# Altium footprint library CADTcommon.PcbLib: 503 footprints (part 5 of 32)
Each footprint in its own frame and in the unit in brackets; x right, y up, seen from the top. Pads: shape width x height; smd on the part's side, far side on the other; paste and mask are expansions set on the pad; w line width, h text height; cw(c..) or ccw(c..) is an arc to the next point about the centre after c.
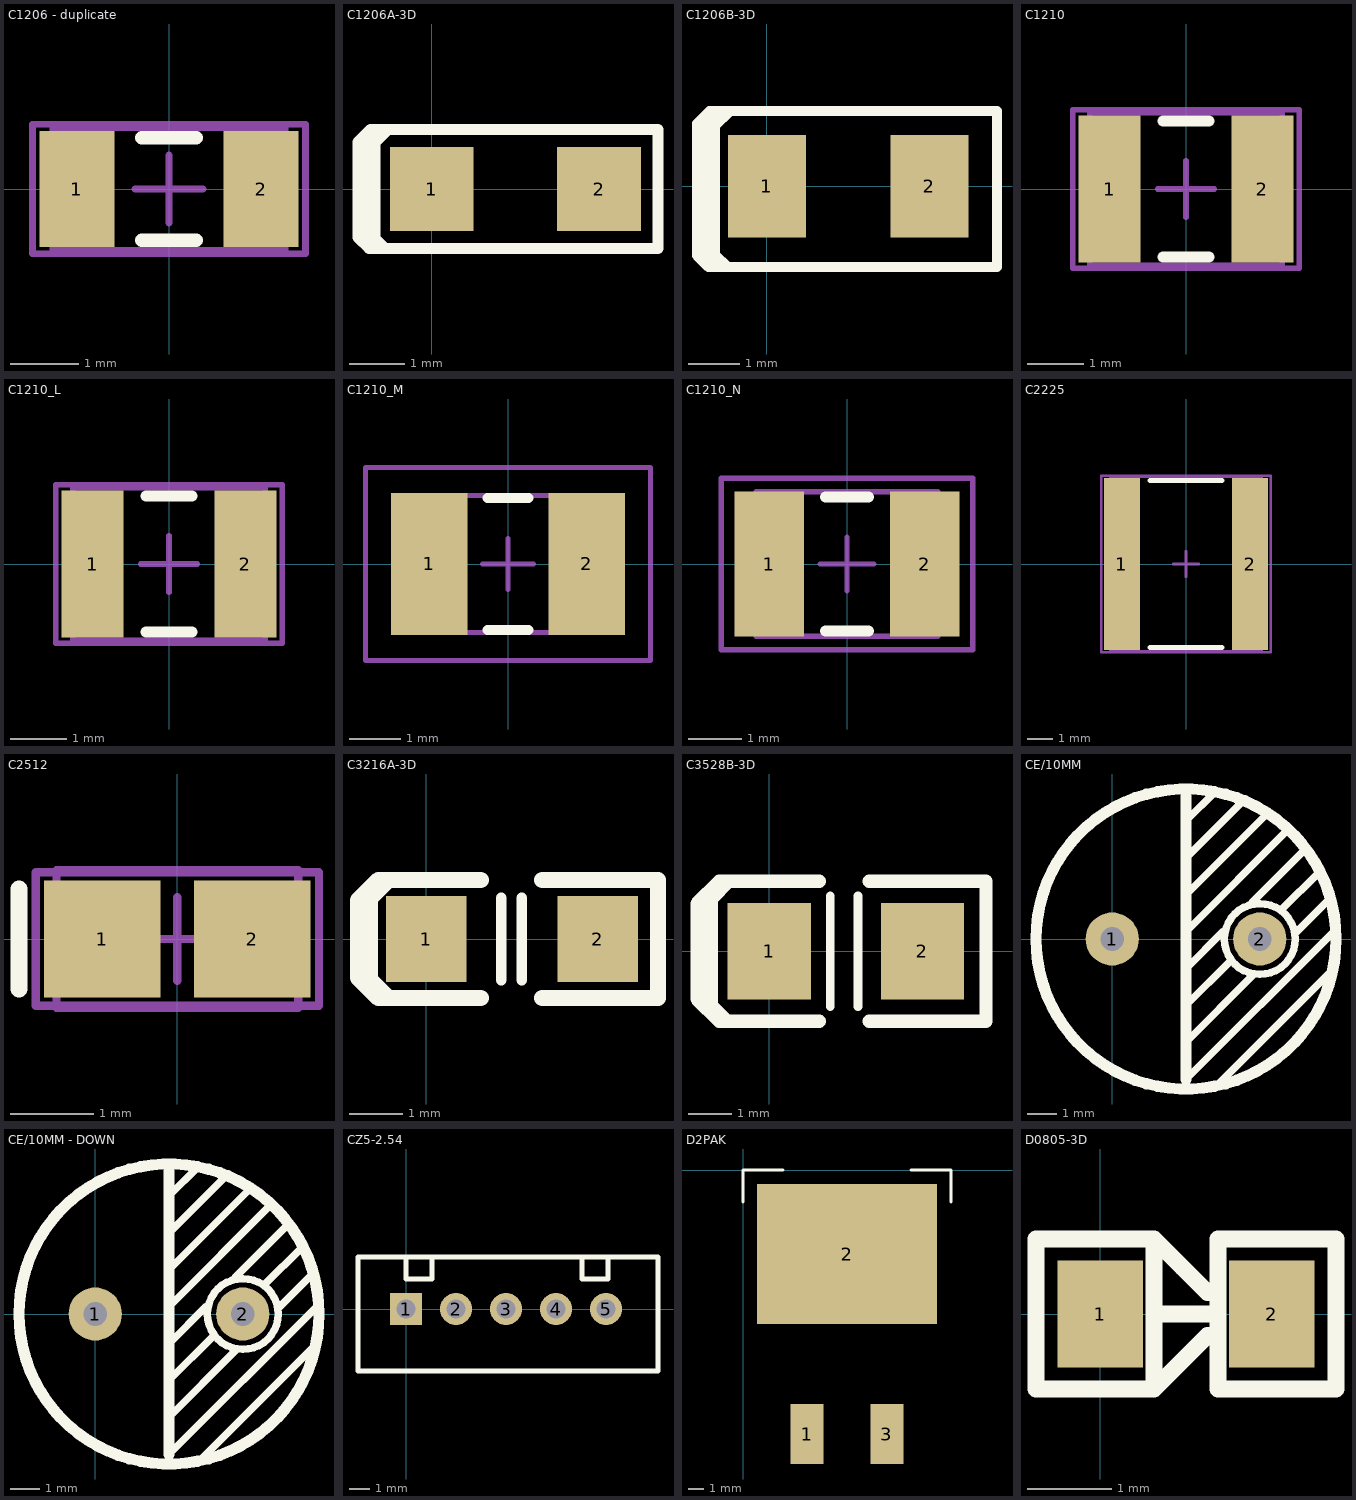
[diagram p4: the footprints below, top view; thin cyan lines are the x and y axes]

## C1206 - duplicate [mm] "Chip Capacitor, Body 3.2x1.6mm, IPC High Density"
height 1.3
pads (2):
  rect 1.1x1.7 smd: 1(-1.35,0) 2(1.35,0)
Top Overlay:
  lines w0.2: -0.4,-0.75 0.4,-0.75 ; -0.4,0.75 0.4,0.75
Mechanical 13:
  lines w0.1: -1.7,-0.9 1.7,-0.9 1.7,0.9 -1.7,0.9 -1.7,-0.9
Mechanical 15:
  lines w0.1: -0.5,0 0.5,0 ; 0,-0.5 0,0.5 ; -2,-0.95 2,-0.95 2,0.95 -2,0.95 -2,-0.95
3D body: height 1.3, standoff 0, extent -1.7,-0.9 1.7,0.9

## C1206A-3D [mm]
pads (2):
  rect 1.5x1.5 smd: 1(0,0) 2(3,0)
Top Overlay:
  lines w0.203: -1.143,-0.889 -1.143,0.889 ; -1.016,-0.635 -1.016,-0.888 -0.837,-1.067 -1.116,-1.067 -1.319,-0.864 -1.319,0.838 -1.091,1.067 -1.016,1.067 ; -1.016,0.533 -1.016,0.837 -0.786,1.067 ; -1.016,1.067 0.914,1.067 2.151,1.067 4.056,1.067 4.056,1.041 4.056,-1.067 2.176,-1.067 0.914,-1.067 -0.991,-1.067 -1.016,-1.041 -1.016,1.067
3D body: height 0.95, standoff 0, extent -0.102,-0.813 3.098,0.787

## C1206B-3D [mm]
pads (2):
  rect 1.524x2 smd: 1(0,0) 2(3.175,0)
Top Overlay:
  lines w0.025: -1,-1 -1,1
  lines w0.203: -1.367,-1.21 -1.367,1.124 -1.212,1.2 -1.212,-1.4 -1.143,-1.524 -1.143,1.397 -1.067,1.473 ; -1.367,-0.965 -1.367,-1.351 -1.143,-1.575 ; -1.016,-0.737 -1.016,-1.333 -0.775,-1.575 ; -1.016,0.61 -1.016,1.181 -0.724,1.473 ; 2.134,1.473 4.42,1.473 4.496,1.473 4.496,-1.575 4.445,-1.575 2.159,-1.575 ; 2.73,1.473 0.838,1.473 -1.067,1.473 ; 2.781,-1.575 0.787,-1.575 -1.118,-1.575 -1.143,-1.575 ; -1.143,-1.575 -1.092,-1.575 ; -1.143,-1.575 -1.092,-1.575 ; -1.118,1.473 -1.016,1.473 -1.016,-1.499 -1.092,-1.575 ; -1.118,1.473 -1.367,1.224 -1.367,-1.3 -1.092,-1.575 ; -1.118,1.473 -1.067,1.473 ; -1.118,1.473 -1.067,1.473
3D body: height 0.95, standoff 0, extent 0.025,-0.813 3.225,0.787

## C1210 [mm] "Chip Capacitor, Body 3.2x2.5mm, IPC High Density"
height 1.3
pads (2):
  rect 1.1x2.6 smd: 1(-1.35,0) 2(1.35,0)
Top Overlay:
  lines w0.2: -0.4,-1.2 0.4,-1.2 ; -0.4,1.2 0.4,1.2
Mechanical 13:
  lines w0.1: -1.7,-1.35 1.7,-1.35 1.7,1.35 -1.7,1.35 -1.7,-1.35
Mechanical 15:
  lines w0.1: -0.5,0 0.5,0 ; 0,-0.5 0,0.5 ; -2,-1.4 2,-1.4 2,1.4 -2,1.4 -2,-1.4
3D body: height 1.3, standoff 0, extent -1.7,-1.35 1.7,1.35

## C1210_L [mm] "Chip Capacitor, Body 3.2x2.5mm, IPC High Density"
height 1.5
pads (2):
  rect 1.1x2.6 smd: 1(-1.35,0) 2(1.35,0)
Top Overlay:
  lines w0.2: -0.4,-1.2 0.4,-1.2 ; -0.4,1.2 0.4,1.2
Mechanical 13:
  lines w0.1: -1.7,-1.35 -1.7,1.35 1.7,1.35 1.7,-1.35 -1.7,-1.35
Mechanical 15:
  lines w0.1: -0.5,0 0.5,0 ; 0,-0.5 0,0.5 ; -2,-1.4 -2,1.4 2,1.4 2,-1.4 -2,-1.4
3D body: height 1.5, standoff 0, extent -1.7,-1.35 1.7,1.35

## C1210_M [mm] "Chip Capacitor, Body 3.2x2.5mm, IPC Low Density"
height 1.5
pads (2):
  rect 1.5x2.8 smd: 1(-1.55,0) 2(1.55,0)
Top Overlay:
  lines w0.2: -0.4,-1.3 0.4,-1.3 ; -0.4,1.3 0.4,1.3
Mechanical 13:
  lines w0.1: -1.7,-1.35 1.7,-1.35 1.7,1.35 -1.7,1.35 -1.7,-1.35
Mechanical 15:
  lines w0.1: -0.5,0 0.5,0 ; 0,-0.5 0,0.5 ; -2.8,-1.9 2.8,-1.9 2.8,1.9 -2.8,1.9 -2.8,-1.9
3D body: height 1.5, standoff 0, extent -1.7,-1.35 1.7,1.35

## C1210_N [mm] "Chip Capacitor, Body 3.2x2.5mm, IPC Medium Density"
height 1.5
pads (2):
  rect 1.3x2.7 smd: 1(-1.45,0) 2(1.45,0)
Top Overlay:
  lines w0.2: -0.4,-1.25 0.4,-1.25 ; -0.4,1.25 0.4,1.25
Mechanical 13:
  lines w0.1: -1.7,-1.35 -1.7,1.35 1.7,1.35 1.7,-1.35 -1.7,-1.35
Mechanical 15:
  lines w0.1: -0.5,0 0.5,0 ; 0,-0.5 0,0.5 ; -2.35,-1.6 -2.35,1.6 2.35,1.6 2.35,-1.6 -2.35,-1.6
3D body: height 1.5, standoff 0, extent -1.7,-1.35 1.7,1.35

## C2225 [mm] "Chip Capacitor, Body 5.7x6.4mm, IPC High Density"
height 1.4
pads (2):
  rect 1.4x6.7 smd: 1(-2.5,0) 2(2.5,0)
Top Overlay:
  lines w0.2: -1.4,-3.25 1.4,-3.25 ; -1.4,3.25 1.4,3.25
Mechanical 13:
  lines w0.1: -2.95,-3.4 -2.95,3.4 2.95,3.4 2.95,-3.4 -2.95,-3.4
Mechanical 15:
  lines w0.1: -0.5,0 0.5,0 ; 0,-0.5 0,0.5 ; -3.3,-3.45 -3.3,3.45 3.3,3.45 3.3,-3.45 -3.3,-3.45
3D body: height 1.4, standoff 0, extent -2.95,-3.4 2.95,3.4

## C2512 [mm] "Chip Capacitor, Body 2.54x1.27mm, IPC High Density"
height 1.3
pads (2):
  rect 1.4x1.4 smd: 1(-0.9,0) 2(0.9,0)
Top Overlay:
  lines w0.2: -1.9,-0.6 -1.9,0.6
Mechanical 13:
  lines w0.1: -1.45,-0.825 1.45,-0.825 1.45,0.825 -1.45,0.825 -1.45,-0.825
Mechanical 15:
  lines w0.1: -0.5,0 0.5,0 ; 0,-0.5 0,0.5 ; -1.7,-0.8 1.7,-0.8 1.7,0.8 -1.7,0.8 -1.7,-0.8
3D body: height 1.3, standoff 0, extent -1.45,-0.825 1.45,0.825

## C3216A-3D [mm]
pads (2):
  rect 1.5x1.6 smd: 1(0,0) 2(3.2,0)
Top Overlay:
  lines w0.2: -1.083,-0.822 -1.083,0.906 ; -1,-1 -1,1 ; -1,-0.762 -0.973,-0.762 -0.635,-1.1 ; -1,0.762 -0.973,0.762 -0.635,1.1 ; 1.397,-0.762 1.397,0.762 ; 1.778,-0.762 1.778,0.762
  lines w0.305: 1.016,-1.1 -0.889,-1.1 -1.27,-0.719 -1.27,0.719 -0.889,1.1 1.016,1.1 ; 2.159,-1.1 4.318,-1.1 4.318,1.1 2.159,1.1
3D body: height 1.6, standoff 0, extent 0.051,-0.787 3.251,0.813

## C3528B-3D [mm]
pads (2):
  rect 1.9x2.2 smd: 1(0,0) 2(3.5,0)
Top Overlay:
  lines w0.2: -1.417,-1.25 -1.417,1.326 ; -1.27,-1.397 -1.27,1.179 -0.889,1.56 ; -1.27,-1.143 -1.27,-1.219 -0.889,-1.6 ; 1.397,-1.27 1.397,1.27 ; 2.032,-1.27 2.032,1.27
  lines w0.3: -1.651,-1.092 -1.651,1.092 ; 4.953,-1.6 4.953,1.6
  lines w0.305: -1.651,-1.092 -1.143,-1.6 1.143,-1.6 ; -1.651,1.092 -1.143,1.6 1.143,1.6 ; 2.286,-1.6 4.953,-1.6 ; 2.286,1.6 4.953,1.6
3D body: height 1.9, standoff 0, extent 0.025,-1.397 3.525,1.403

## CE/10MM [mm]
pads (2):
  round 1.8 hole 0.8: 1(0,0) 2(5,0)
Top Overlay:
  circle w0.381: c2.5,0 r5.08
  circle w0.254: c5,0 r1.2
  lines w0.254: 2.5,-4.75 7.5,0.25 ; 2.5,-3.5 4.75,-1.25 ; 2.5,-2.25 4,-0.75 ; 2.5,-1 3.75,0.25 ; 2.5,0.25 6,3.75 ; 2.5,1.5 5.25,4.25 ; 2.5,4 3.5,5 ; 2.625,2.875 4.5,4.75 ; 3.5,-5 7.5,-1 ; 4.75,1.25 6.5,3 ; 5.75,1 7,2.25 ; 6.25,0.25 7.25,1.25 ; 7.371,-1.589 7.4,-1.425
  lines w0.381: 2.5,-4.75 2.5,4.826
3D body: height 16.53, standoff -3.74, extent -2.551,-5 7.5,5.051

## CE/10MM - DOWN [mm]
pads (2):
  round 1.8 hole 0.8: 1(0,0) 2(5,0)
Top Overlay:
  circle w0.254: c5,0 r1.2
  circle w0.381: c2.5,0 r5.08
  lines w0.254: 2.5,-4.75 7.5,0.25 ; 2.5,-3.5 4.75,-1.25 ; 2.5,-2.25 4,-0.75 ; 2.5,-1 3.75,0.25 ; 2.5,0.25 6,3.75 ; 2.5,1.5 5.25,4.25 ; 2.5,4 3.5,5 ; 2.625,2.875 4.5,4.75 ; 3.5,-5 7.5,-1 ; 4.75,1.25 6.5,3 ; 5.75,1 7,2.25 ; 6.25,0.25 7.25,1.25 ; 7.371,-1.589 7.4,-1.425
  lines w0.381: 2.5,-4.75 2.5,4.826
3D body: height 16.53, standoff -3.74, extent -2.551,-5 7.5,5.051

## CZ5-2.54 [mm]
pads (5):
  rect 1.6x1.6 hole 0.95: 1(0,0)
  round 1.6 hole 0.95: 2(2.5,0) 3(5,0) 4(7.5,0) 5(10,0)
Top Overlay:
  lines w0.254: 0,2.6 0,1.5 1.3,1.5 1.3,2.6 ; 8.8,2.6 8.8,1.5 10.1,1.5 10.1,2.6 ; -2.4,-3.1 -2.4,2.6 12.6,2.6 12.6,-3.1 -2.4,-3.1
3D body: height 7, standoff -3.4, extent -2.511,-3.388 12.519,2.362

## D2PAK [mil]
pads (3):
  rect 82x150 smd: 1(160,-660) 3(360,-660)
  rect 450x350 smd: 2(260,-210)
Top Overlay:
  lines w8: 0,-80 0,0 100,0 ; 420,0 520,0 520,-80

## D0805-3D [mil]
pads (2):
  rect 40x50 smd: 1(0,0) 2(80,0)
Top Overlay:
  lines w7.87: 25,0 50,0 ; 31.09,28.91 31.52,28.48 ; 38.07,21.93 38.19,21.81 ; 50,-10 25,-35 ; 50,10 25,35 ; 55,-10 55,5 55,0 ; 25,-35 -30,-35 -30,35 25,35 ; 25,-35 25,35 ; 55,-35 110,-35 110,35 55,35 55,-35
3D body: height 33.45, standoff 0.23, extent -0.2,-16.84 81,18.84